# Altium footprint library EXPLORER.PcbLib: 252 footprints (part 12 of 16)
Each footprint in its own frame and in the unit in brackets; x right, y up, seen from the top. Pads: shape width x height; smd on the part's side, far side on the other; paste and mask are expansions set on the pad; w line width, h text height; cw(c..) or ccw(c..) is an arc to the next point about the centre after c.
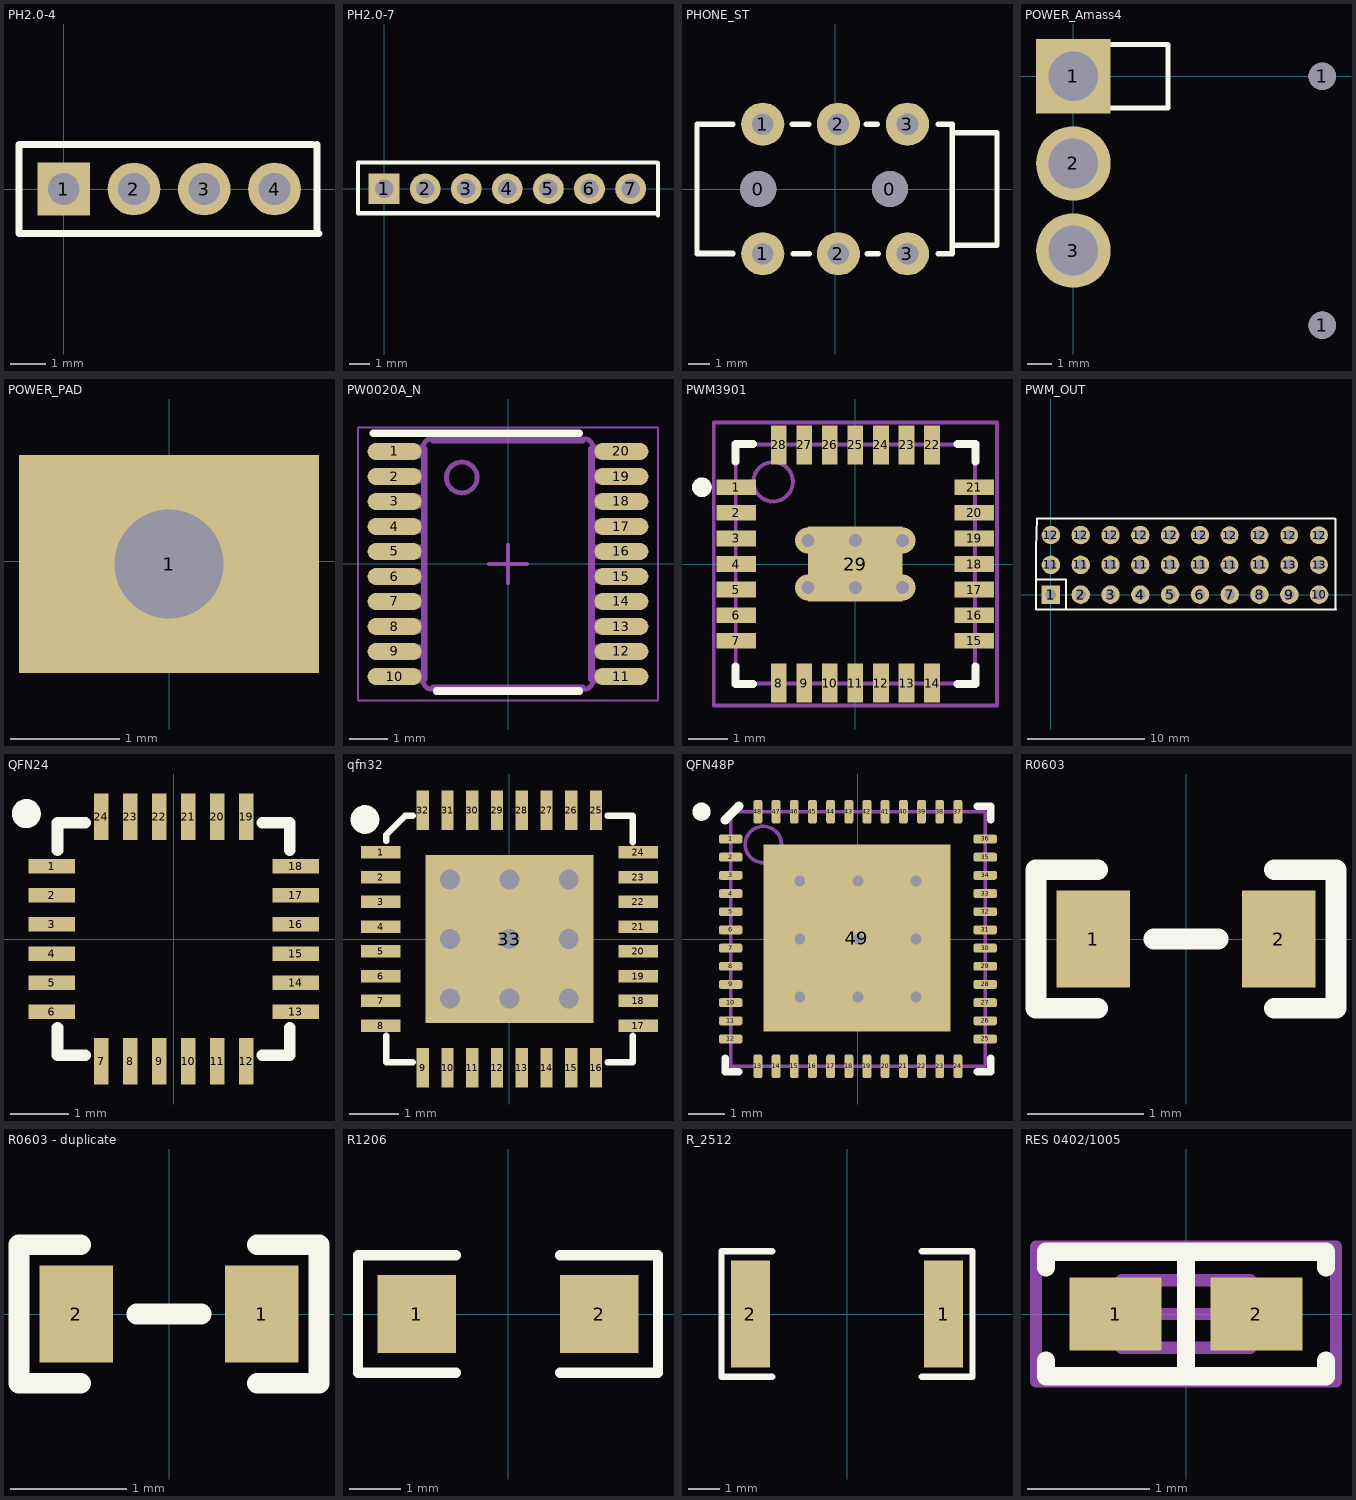
[diagram p11: the footprints below, top view; thin cyan lines are the x and y axes]

## PH2.0-4 [mm]
pads (4):
  rect 1.5x1.5 hole 0.9: 1(0,0)
  round 1.5 hole 0.9: 2(2,0) 3(4,0) 4(6,0)
Top Overlay:
  lines w0.2: 7.087,1.27 -1.27,1.27 -1.27,-1.27 7.264,-1.27 ; 7.214,-1.27 7.214,1.27

## PH2.0-7 [mm]
pads (7):
  rect 1.5x1.5 hole 0.9: 1(0,0)
  round 1.5 hole 0.9: 2(2,0) 3(4,0) 4(6,0) 5(8,0) 6(10,0) 7(12,0)
Top Overlay:
  lines w0.2: 13.233,-1.194 -1.27,-1.194 -1.27,1.27 13.259,1.27 ; 13.335,-1.295 13.335,1.245

## PHONE_ST [mm]
pads (8):
  round 1.676 hole 1.676: 0(-3.556,0) 0(2.54,0)
  round 2 hole 1: 1(-3.35,-3) 1(-3.35,3) 2(0.15,-3) 2(0.15,3) 3(3.35,-3) 3(3.35,3)
Top Overlay:
  lines w0.254: -6.393,-2.969 -4.742,-2.969 ; -4.742,-3.007 -6.393,-3.007 -6.393,3 -4.742,3 ; -1.986,3 -1.224,3 ; -1.948,-3.007 -1.186,-3.007 ; 1.443,3 1.951,3 ; 1.481,-3.007 1.989,-3.007 ; 4.783,-3.007 5.33,-3.007 ; 4.783,3 5.418,3 5.418,-3.007 ; 5.418,-2.6 7.493,-2.6 7.493,2.6 5.418,2.6

## POWER_Amass4 [mm]
pads (5):
  rect 3x3 hole 2: 1(0,0)
  round 1.1 hole 1.1: 1(10,-10) 1(10,0)
  round 3 hole 2: 2(0,-3.5) 3(0,-7)
Top Overlay:
  lines w0.2: -1.27,-1.27 -1.27,1.27 3.81,1.27 3.81,-1.27 -1.27,-1.27

## POWER_PAD [mm]
height 1.75
pads (1):
  rect 2.75x2 hole 1: 1(0,-0.025)

## PW0020A_N [mm] "TSOP, 20-Leads, Body 6.5x4.4mm, Pitch 0.65mm, IPC Medium Density"
height 1.2
pads (20):
  oval 1.4x0.45 smd: 1(-2.95,2.925) 2(-2.95,2.275) 3(-2.95,1.625) 4(-2.95,0.975) 5(-2.95,0.325) 6(-2.95,-0.325) 7(-2.95,-0.975) 8(-2.95,-1.625) 9(-2.95,-2.275) 10(-2.95,-2.925) 11(2.95,-2.925) 12(2.95,-2.275) 13(2.95,-1.625) 14(2.95,-0.975) 15(2.95,-0.325) 16(2.95,0.325) 17(2.95,0.975) 18(2.95,1.625) 19(2.95,2.275) 20(2.95,2.925)
Top Overlay:
  lines w0.2: -3.5,3.4 1.85,3.4
Top Overlay keep-out:
  lines w0.2: -1.85,-3.3 1.85,-3.3
Mechanical 5:
  drawing of 254 lines, arcs and shapes, not listed
  text ".Designator" at -0.45,1.8 h1.02
Mechanical 15:
  lines w0.05: -3.9,-3.55 3.9,-3.55 3.9,3.55 -3.9,3.55 -3.9,-3.55
  lines w0.1: -0.5,0 0.5,0 ; 0,-0.5 0,0.5
3D body: height 1, standoff 0, extent -3.21,-3.25 3.21,3.25

## PWM3901 [mm] "QFN, 28-Leads, Body 6.1x6.1mm (max), Pitch 0.65mm, IPC Medium Density"
height 0.8
pads (29):
  rect 1x0.4 smd: 1(-3.025,1.95) 2(-3.025,1.3) 3(-3.025,0.65) 4(-3.025,0) 5(-3.025,-0.65) 6(-3.025,-1.3) 7(-3.025,-1.95) 15(3.025,-1.95) 16(3.025,-1.3) 17(3.025,-0.65) 18(3.025,0) 19(3.025,0.65) 20(3.025,1.3) 21(3.025,1.95)
  rect 0.4x1 smd: 8(-1.95,-3.025) 9(-1.3,-3.025) 10(-0.65,-3.025) 11(0,-3.025) 12(0.65,-3.025) 13(1.3,-3.025) 14(1.95,-3.025) 22(1.95,3.025) 23(1.3,3.025) 24(0.65,3.025) 25(0,3.025) 26(-0.65,3.025) 27(-1.3,3.025) 28(-1.95,3.025)
  rect 2.4x1.9 smd: 29(0,0)
via -1.2,0.6 diameter 0.66 hole 0.33
via 0,0.6 diameter 0.66 hole 0.33
via 1.2,0.6 diameter 0.66 hole 0.33
via -1.2,-0.6 diameter 0.66 hole 0.33
via 0,-0.6 diameter 0.66 hole 0.33
via 1.2,-0.6 diameter 0.66 hole 0.33
Top Overlay:
  circle w0.25: c-3.9,1.95 r0.125
  lines w0.2: -3.05,-2.6 -3.05,-3.05 -2.6,-3.05 ; -3.05,2.6 -3.05,3.05 -2.6,3.05 ; 2.6,-3.05 3.05,-3.05 3.05,-2.6 ; 2.6,3.05 3.05,3.05 3.05,2.6
Mechanical 13:
  circle w0.1: c-2.09,2.09 r0.5
  lines w0.1: -3.04,-3.04 -3.04,3.04 3.04,3.04 3.04,-3.04 -3.04,-3.04
Mechanical 15:
  lines w0.1: -0.5,0 0.5,0 ; 0,-0.5 0,0.5 ; -3.6,-3.6 -3.6,3.6 3.6,3.6 3.6,-3.6 -3.6,-3.6
3D body: height 0.8, standoff 0.01, extent -3.04,-3.04 3.04,3.04

## PWM_OUT [mil]
pads (30):
  rect 62x62 hole 35: 1(0.42,0.42)
  round 62 hole 35: 2(100.42,0.42) 3(200.43,0.42) 4(300.43,0.42) 5(400.43,0.42) 6(500.43,0.42) 7(600.42,0.42) 8(700.42,0.42) 9(800.42,0.42) 10(900.42,0.42) 11(0.42,100.42) 11(100.42,100.42) 11(200.43,100.42) 11(300.43,100.42) 11(400.43,100.42) 11(500.43,100.42) 11(700.42,100.42) 12(0.42,200.43) 12(100.42,200.43) 12(200.43,200.43) 12(300.43,200.43) 12(400.43,200.43) 12(500.43,200.43)
  round 60 hole 35: 11(600,100) 12(600,200) 12(700,200) 12(800,200) 12(900,200) 13(800,100) 13(900,100)
Top Overlay:
  lines w7: -49.58,51.18 51.18,51.18 51.18,-49.58 ; 954,256.48 -45.97,256.48 -49.58,155.87 -49.58,150.43 -49.58,-49.58 957,-49.58 ; 955,-50 955,254.48

## QFN24 [mm]
pads (24):
  rect 0.8x0.25 smd: 1(-2.101,1.25) 2(-2.101,0.75) 3(-2.101,0.25) 4(-2.101,-0.25) 5(-2.101,-0.75) 6(-2.101,-1.25) 13(2.101,-1.25) 14(2.101,-0.75) 15(2.101,-0.25) 16(2.101,0.25) 17(2.101,0.75) 18(2.101,1.25)
  rect 0.25x0.8 smd: 7(-1.25,-2.101) 8(-0.75,-2.101) 9(-0.25,-2.101) 10(0.25,-2.101) 11(0.75,-2.101) 12(1.25,-2.101) 19(1.25,2.101) 20(0.75,2.101) 21(0.25,2.101) 22(-0.25,2.101) 23(-0.75,2.101) 24(-1.25,2.101)
Top Overlay:
  circle w0.25: c-2.538,2.159 r0.125
  lines w0.2: -2,-1.525 -2,-2 -1.525,-2 ; -2,1.525 -2,2 -1.525,2 ; 1.525,-2 2,-2 2,-1.525 ; 1.525,2 2,2 2,1.525

## qfn32 [mm]
pads (33):
  rect 0.8x0.25 smd: 1(-2.601,1.75) 2(-2.601,1.25) 3(-2.601,0.75) 4(-2.601,0.25) 5(-2.601,-0.25) 6(-2.601,-0.75) 7(-2.601,-1.25) 8(-2.601,-1.75) 17(2.601,-1.75) 18(2.601,-1.25) 19(2.601,-0.75) 20(2.601,-0.25) 21(2.601,0.25) 22(2.601,0.75) 23(2.601,1.25) 24(2.601,1.75)
  rect 0.25x0.8 smd: 9(-1.75,-2.601) 10(-1.25,-2.601) 11(-0.75,-2.601) 12(-0.25,-2.601) 13(0.25,-2.601) 14(0.75,-2.601) 15(1.25,-2.601) 16(1.75,-2.601) 25(1.75,2.601) 26(1.25,2.601) 27(0.75,2.601) 28(0.25,2.601) 29(-0.25,2.601) 30(-0.75,2.601) 31(-1.25,2.601) 32(-1.75,2.601)
  rect 3.4x3.4 smd: 33(0,0)
via 1.2,-1.2 diameter 0.7 hole 0.4
via 0,-1.2 diameter 0.7 hole 0.4
via -1.2,-1.2 diameter 0.7 hole 0.4
via 1.2,0 diameter 0.7 hole 0.4
via 0,0 diameter 0.7 hole 0.4
via -1.2,0 diameter 0.7 hole 0.4
via 1.2,1.2 diameter 0.7 hole 0.4
via 0,1.2 diameter 0.7 hole 0.4
via -1.2,1.2 diameter 0.7 hole 0.4
Top Overlay:
  circle w0.3: c-2.919,2.413 r0.14
  lines w0.127: -2.489,-1.956 -2.489,-2.489 -1.956,-2.489 ; -2.489,1.981 -2.489,2.108 -2.108,2.489 -1.956,2.489 ; 1.981,-2.489 2.489,-2.489 2.489,-1.956 ; 1.981,2.489 2.489,2.489 2.489,1.956
Mechanical 15:
  lines w0.1: -0.5,0 0.5,0 ; 0,-0.5 0,0.5

## QFN48P [mm]
pads (49):
  rrect50% 0.65x0.245 smd: 1(-3.5,2.75) 2(-3.5,2.25) 3(-3.5,1.75) 4(-3.5,1.25) 5(-3.5,0.75) 6(-3.5,0.25) 7(-3.5,-0.25) 8(-3.5,-0.75) 9(-3.5,-1.25) 10(-3.5,-1.75) 11(-3.5,-2.25) 12(-3.5,-2.75) 25(3.5,-2.75) 26(3.5,-2.25) 27(3.5,-1.75) 28(3.5,-1.25) 29(3.5,-0.75) 30(3.5,-0.25) 31(3.5,0.25) 32(3.5,0.75) 33(3.5,1.25) 34(3.5,1.75) 35(3.5,2.25) 36(3.5,2.75)
  rrect50% 0.245x0.65 smd: 13(-2.75,-3.5) 14(-2.25,-3.5) 15(-1.75,-3.5) 16(-1.25,-3.5) 17(-0.75,-3.5) 18(-0.25,-3.5) 19(0.25,-3.5) 20(0.75,-3.5) 21(1.25,-3.5) 22(1.75,-3.5) 23(2.25,-3.5) 24(2.75,-3.5) 37(2.75,3.5) 38(2.25,3.5) 39(1.75,3.5) 40(1.25,3.5) 41(0.75,3.5) 42(0.25,3.5) 43(-0.25,3.5) 44(-0.75,3.5) 45(-1.25,3.5) 46(-1.75,3.5) 47(-2.25,3.5) 48(-2.75,3.5)
  rect 5.15x5.15 smd: 49(-0.025,0.025)
via 0,1.6 diameter 0.6 hole 0.3
via 1.6,1.6 diameter 0.6 hole 0.3
via 1.6,0 diameter 0.6 hole 0.3
via 1.6,-1.6 diameter 0.6 hole 0.3
via 0,-1.6 diameter 0.6 hole 0.3
via -1.6,-1.6 diameter 0.6 hole 0.3
via -1.6,0 diameter 0.6 hole 0.3
via -1.6,1.6 diameter 0.6 hole 0.3
via 0.005,0.005 diameter 0.6 hole 0.3
Top Overlay:
  circle w0.25: c-4.3,3.5 r0.125
  lines w0.2: -3.65,-3.275 -3.65,-3.65 -3.275,-3.65 ; 3.275,-3.65 3.65,-3.65 3.65,-3.275 ; 3.275,3.65 3.65,3.65 3.65,3.275
  lines w0.254: -3.65,3.275 -3.275,3.65
Mechanical 13:
  circle w0.1: c-2.6,2.6 r0.5
  lines w0.1: -3.5,-3.5 3.5,-3.5 3.5,3.5 -3.5,3.5 -3.5,-3.5
3D body: height 1, standoff 0, extent -3.495,-3.495 3.505,3.505

## R0603 [mil] "ÌùÆ"
height 20
pads (2):
  rect 25x33 smd: 1(-31.5,0) 2(31.5,0)
Top Overlay:
  lines w7: -30,-23.5 -51,-23.5 -51,23.5 -30,23.5 ; -11,0 11,0 ; 30,-23.5 51,-23.5 51,23.5 30,23.5
3D body: height 20, standoff 18, extent -20.4,-15.5 20.5,15.5
3D body: height 18, standoff 0, extent -20.4,-15.5 20.5,15.5
3D body: height 20, standoff 0, extent -31.72,-15.72 -20.4,15.72
3D body: height 20, standoff 0, extent 20.4,-15.72 31.72,15.72

## R0603 - duplicate [mil] "ÌùÆ"
height 20
pads (2):
  rect 25x33 smd: 1(31.5,0) 2(-31.5,0)
Top Overlay:
  lines w7: -30,-23.5 -51,-23.5 -51,23.5 -30,23.5 ; -11,0 11,0 ; 30,-23.5 51,-23.5 51,23.5 30,23.5
3D body: height 20, standoff 0, extent -31.72,-15.72 -20.4,15.72
3D body: height 20, standoff 0, extent 20.4,-15.72 31.72,15.72
3D body: height 18, standoff 0, extent -20.5,-15.5 20.4,15.5
3D body: height 20, standoff 18, extent -20.5,-15.5 20.4,15.5

## R1206 [mil] "贴片元件"
height 59.06
pads (2):
  rect 60x60 smd: 1(-70,0) 2(70,0)
Top Overlay:
  lines w7.87: -40,-45 -115,-45 -115,45 -40,45 ; 40,-45 115,-45 115,45 40,45
3D body: height 39.37, standoff 0, extent -75,-35 -55,35
3D body: height 39.37, standoff 0, extent 55,-35 75,35
3D body: height 39.37, standoff 0, extent -55,-35 55,35

## R_2512 [mm]
pads (2):
  rect 1.25x3.42 smd: 1(3.1,0) 2(-3.1,0)
Top Overlay:
  lines w0.2: -2.4,-2.01 -4.025,-2.01 -4.025,2.01 -2.4,2.01 ; 2.4,-2.01 4.025,-2.01 4.025,2.01 2.4,2.01
3D body: height 0.62, standoff 0, extent -3.16,-1.6 3.159,1.6

## RES 0402/1005 [mm]
pads (2):
  rect 0.75x0.6 smd: 1(-0.575,0) 2(0.575,0)
Top Overlay:
  lines w0.15: -1.143,-0.381 -1.143,-0.508 1.143,-0.508 1.143,-0.381 ; -1.143,0.381 -1.143,0.508 1.143,0.508 1.143,0.381 ; 0,-0.508 0,0.508
Mechanical 13:
  lines w0.1: -0.525,-0.275 0.525,-0.275 0.525,0.275 -0.525,0.275 -0.525,-0.275
Mechanical 15:
  lines w0.1: -0.275,0 0.275,0 ; 0,-0.275 0,0.275 ; -1.225,-0.55 1.225,-0.55 1.225,0.55 -1.225,0.55 -1.225,-0.55
3D body: height 0.35, standoff 0, extent -0.5,-0.25 0.5,0.25